# Altium footprint library JL_PCB.PCBLIB: 1112 footprints (part 12 of 71)
Each footprint in its own frame and in the unit in brackets; x right, y up, seen from the top. Pads: shape width x height; smd on the part's side, far side on the other; paste and mask are expansions set on the pad; w line width, h text height; cw(c..) or ccw(c..) is an arc to the next point about the centre after c.
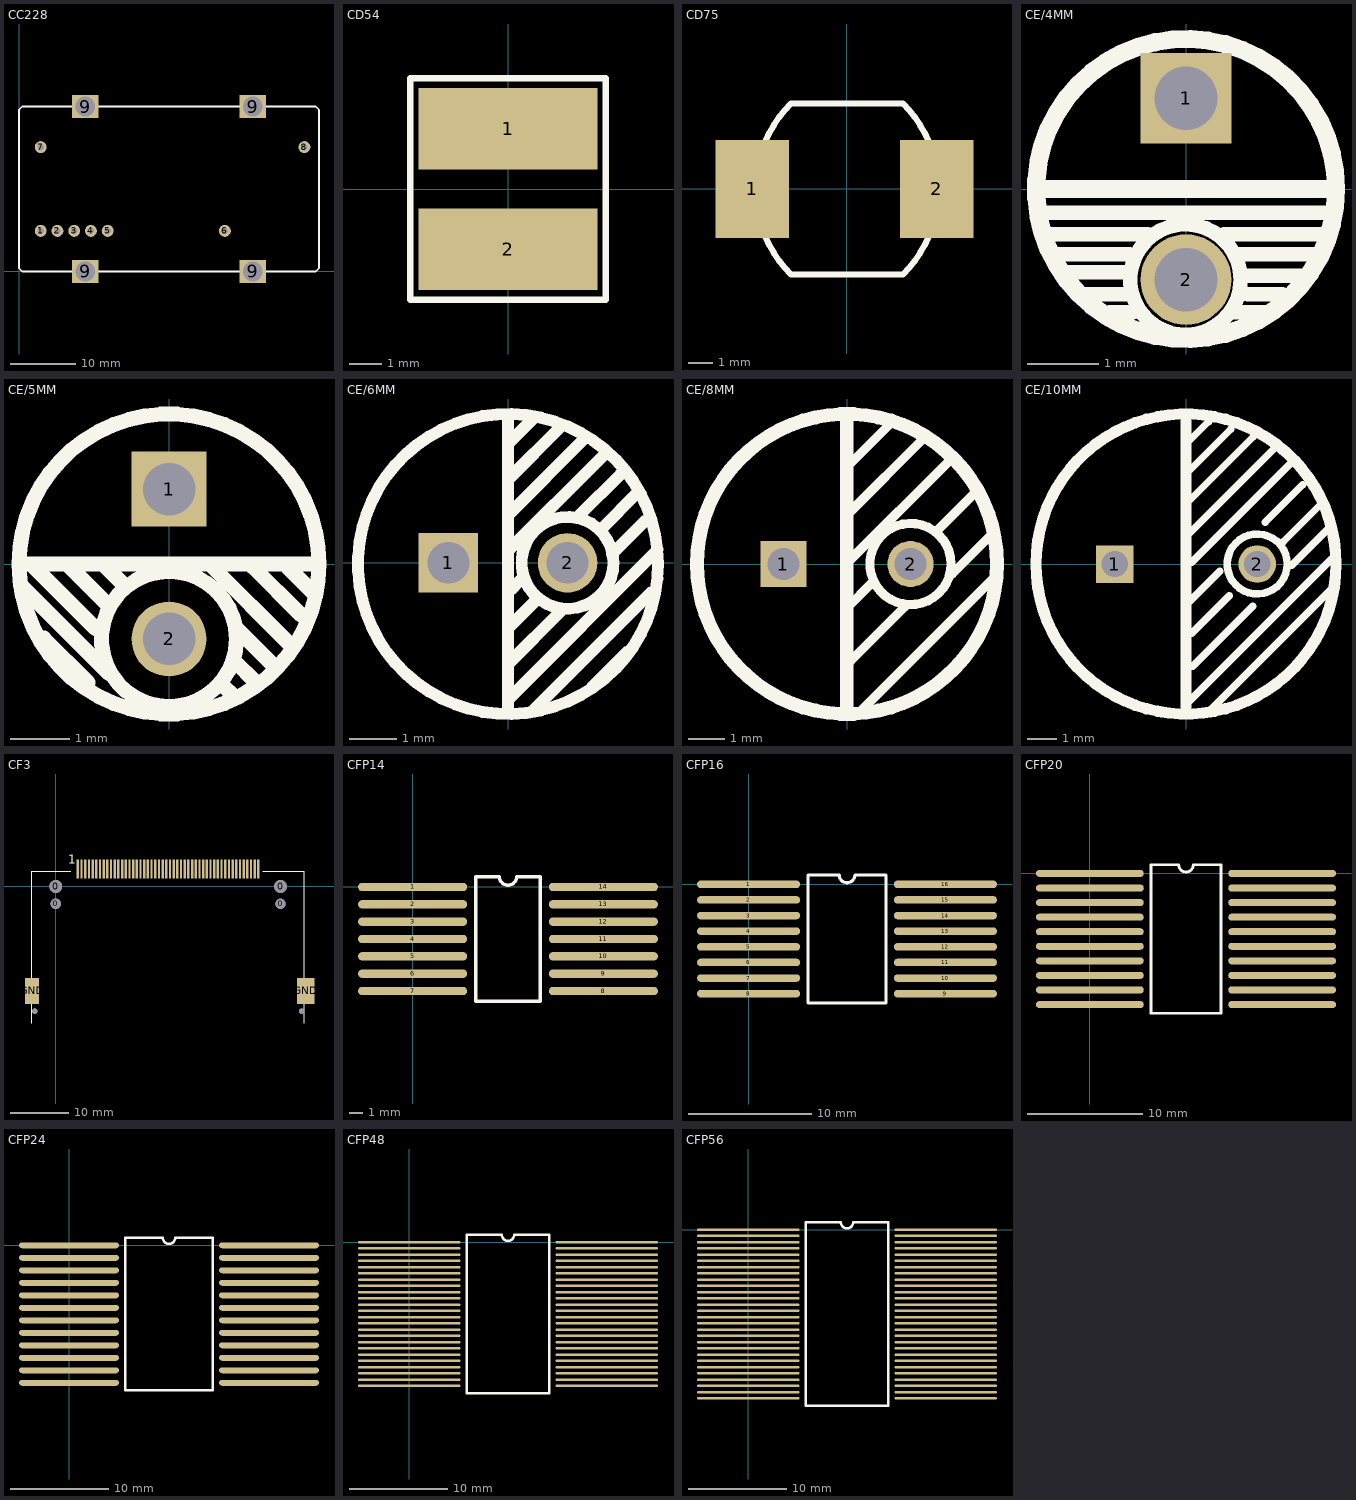
[diagram p11: the footprints below, top view; thin cyan lines are the x and y axes]

## CC228 [mm]
pads (12):
  round 1.8 hole 1: 1(3.29,6.15) 2(5.83,6.15) 3(8.37,6.15) 4(10.91,6.15) 5(13.45,6.15) 6(31.23,6.15) 7(3.29,18.85) 8(43.29,18.85)
  rect 4x3.5 hole 3: 9(10.05,0) 9(10.05,25) 9(35.45,0) 9(35.45,25)
TopOverlay:
  lines w0.254: 0,0.5 0.5,0 45,0 45.5,0.5 45.5,24.5 45,25 0.5,25 0,24.5 0,0.5

## CD54 [mm]
pads (2):
  rect 5.5x2.5 smd: 1(0,1.85) 2(0,-1.85)
TopOverlay:
  lines w0.203: -3,-3.4 -3,3.4 3,3.4 3,-3.4 -3,-3.4

## CD75 [mm]
height 5
pads (2):
  rect 3x4 smd: 1(-3.886,0) 2(3.683,0)
TopOverlay:
  lines w0.254: -2.3,-3.5 cw(c1.2,0) -2.3,3.5 2.3,3.5 cw(c-1.2,0) 2.3,-3.5 -2.3,-3.5
3D body "User Library-SDR0805.step": height 5.07, standoff 0.02, extent -3.728,-3.725 3.626,3.775

## CE/4MM [mil]
pads (2):
  rect 50x50 / inner round 50 / far side rect 50x50 hole 35: 1(0,50)
  round 50 hole 35: 2(0,-50)
TopOverlay:
  circle w8: c-0.29,-50 r30.45
  circle w10: c0,0 r82.77
  lines w8: -79,-13 77,-13 ; -76,-25 -21,-25 ; -73,-36 -31,-36 ; -65,-46 -33,-46 ; -55,-58 -33,-58 ; -42,-68 -29,-68 ; 21,-25 75,-25 ; 27,-68 43,-68 ; 30,-36 72,-36 ; 33,-48 63,-48 ; 34,-58 53,-58
  lines w10: -78.74,0 78.74,0

## CE/5MM [mil]
pads (2):
  rect 50x50 / inner round 50 / far side rect 50x50 hole 35: 1(0,50)
  round 50 hole 35: 2(0,-50)
TopOverlay:
  circle w10: c0,-50 r45
  circle w10: c0,0 r100
  lines w10: -100,0 100,0 ; -99,-14 -40,-73 ; -91,-1 -49,-43 ; -83.5,-49.5 -54,-79 ; -67,-1 -42,-26 ; -44,0 -31,-13 ; 27.5,-0.5 81,-54 ; 35.5,-80.5 43,-88 ; 43.5,-64.5 58,-79 ; 45,-43 71,-69 ; 55.5,-1.5 88,-34 ; 79,-2 96,-19

## CE/6MM [mil]
pads (2):
  rect 50x50 / inner round 50 / far side rect 50x50 hole 35: 1(-50,0)
  round 50 hole 35: 2(50,0)
TopOverlay:
  circle w10: c50,0 r38.6
  circle w10: c0,-1 r126.02
  lines w10: 0,-126 0,120 ; 0,-115 125,10 ; 0,-85 45,-40 ; 0,-55 25,-30 ; 0,10 80,90 ; 0,40 65,105 ; 0,70 45,115 ; 0,100 20,120 ; 2.5,-22.5 10,-15 ; 22.5,-122.5 120,-25 ; 60,40 95,75 ; 70,-105 100,-75 ; 77.5,27.5 110,60 ; 87.5,7.5 115,35

## CE/8MM [mil]
pads (2):
  rect 50x50 / inner round 50 / far side rect 50x50 hole 35: 1(-69,0)
  round 50 hole 35: 2(69,0)
TopOverlay:
  circle w10: c69,0 r44.07
  circle w15: c0,0 r162.93
  lines w10: -0.01,1.01 114.51,115.53 ; 0.29,-47.4 27.54,-20.15 ; 0.58,53.78 84.36,137.56 ; 2.03,107.41 49,154.37 ; 4.06,-105.09 62.62,-46.53 ; 13.63,-161.04 162.64,-12.03 ; 97.41,35.8 141.19,79.58 ; 114.23,-10.58 160.9,36.09
  lines w15: -0.29,-161.04 -0.29,160.75

## CE/10MM [mil]
pads (2):
  rect 50x50 / inner round 50 / far side rect 50x50 hole 35: 1(-95,0)
  round 50 hole 35: 2(95,0)
TopOverlay:
  circle w15: c0,0 r200
  circle w10: c95,0 r40
  lines w10: 0,-165 0,175 ; 0,80 90,170 ; 0,120 60,180 ; 0,160 30,190 ; 1.02,37.3 121.02,157.3 ; 3.96,-183.38 193.96,6.62 ; 5.14,-49.58 45.14,-9.58 ; 7.38,2.6 137.38,132.6 ; 7.61,-92.05 57.61,-42.05 ; 8.99,-136.19 88.99,-56.19 ; 27.55,-199.76 197.55,-29.76 ; 105.7,55.97 155.7,105.97 ; 130,30 180,80 ; 140.92,-1.48 190.92,48.52
  lines w15: 0,-190 0,190

## CF3 [mm]
pads (58):
  round 0.9 hole 0.9 unplated: 0(-3.63,-21.5) 0(42.37,-21.5)
  round 1.75 hole 1.75 unplated: 0(0,-3) 0(38.735,-3)
  round 2.2 hole 2.2 unplated: 0(0,0) 0(38.735,0)
  rect 0.4x3.302 smd: 1(3.81,3.004) 2(5.08,3.004) 3(6.35,3.004) 4(7.62,3.004) 5(8.89,3.004) 6(10.16,3.004) 7(11.43,3.004) 8(12.7,3.004) 9(13.97,3.004) 10(15.24,3.004) 11(16.51,3.004) 12(17.78,3.004) 13(19.05,3.004) 14(20.32,3.004) 15(21.59,3.004) 16(22.86,3.004) 17(24.13,3.004) 18(25.4,3.004) 19(26.67,3.004) 20(27.94,3.004) 21(29.21,3.004) 22(30.48,3.004) 23(31.75,3.004) 24(33.02,3.004) 25(34.29,3.004) 26(4.445,3.004) 27(5.715,3.004) 28(6.985,3.004) 29(8.255,3.004) 30(9.525,3.004) 31(10.795,3.004) 32(12.065,3.004) 33(13.335,3.004) 34(14.605,3.004) 35(15.875,3.004) 36(17.145,3.004) 37(18.415,3.004) 38(19.685,3.004) 39(20.955,3.004) 40(22.225,3.004) 41(23.495,3.004) 42(24.765,3.004) 43(26.035,3.004) 44(27.305,3.004) 45(28.575,3.004) 46(29.845,3.004) 47(31.115,3.004) 48(32.385,3.004) 49(33.655,3.004) 50(34.925,3.004)
  rect 2.4x4.5 smd: GND(-4.09,-18)
  rect 3x4.5 smd: GND(43.12,-18)
TopOverlay:
  lines w0.152: -4.13,2.6 2.585,2.6 ; 35.66,2.6 42.87,2.6
  lines w0.2: -4.13,-23.6 -4.13,2.6 ; 42.87,-23.6 42.87,2.6
  text "1" at 2.11,3.95 h1.52

## CF CARD [mil]

## CFP14 [mil]
pads (14):
  oval 315x24 smd: 1(0,0) 2(0,-50) 3(0,-100) 4(0,-150) 5(0,-200) 6(0,-250) 7(0,-300) 8(550,-300) 9(550,-250) 10(550,-200) 11(550,-150) 12(550,-100) 13(550,-50) 14(550,0)
TopOverlay:
  lines w10: 182,-330 182,30 250,30 ccw(c275,30) 300,30 368,30 368,-330 182,-330

## CFP16 [mil]
pads (16):
  oval 330x24 smd: 1(0,0) 2(0,-50) 3(0,-100) 4(0,-150) 5(0,-200) 6(0,-250) 7(0,-300) 8(0,-350) 9(630,-350) 10(630,-300) 11(630,-250) 12(630,-200) 13(630,-150) 14(630,-100) 15(630,-50) 16(630,0)
TopOverlay:
  lines w10: 190,-380 440,-380 440,30 340,30 cw(c315,30) 290,30 190,30 190,-380

## CFP20 [mil]
pads (20):
  oval 370x24 smd: 1(0,0) 2(0,-50) 3(0,-100) 4(0,-150) 5(0,-200) 6(0,-250) 7(0,-300) 8(0,-350) 9(0,-400) 10(0,-450) 11(660,-450) 12(660,-400) 13(660,-350) 14(660,-300) 15(660,-250) 16(660,-200) 17(660,-150) 18(660,-100) 19(660,-50) 20(660,0)
TopOverlay:
  lines w10: 210,-480 450,-480 450,30 355,30 cw(c330,30) 305,30 210,30 210,-480

## CFP24 [mil]
pads (24):
  oval 400x24 smd: 1(0,0) 2(0,-50) 3(0,-100) 4(0,-150) 5(0,-200) 6(0,-250) 7(0,-300) 8(0,-350) 9(0,-400) 10(0,-450) 11(0,-500) 12(0,-550) 13(800,-550) 14(800,-500) 15(800,-450) 16(800,-400) 17(800,-350) 18(800,-300) 19(800,-250) 20(800,-200) 21(800,-150) 22(800,-100) 23(800,-50) 24(800,0)
TopOverlay:
  lines w10: 225,-580 225,30 375,30 ccw(c400,30) 425,30 575,30 575,-580 225,-580

## CFP48 [mil]
pads (48):
  oval 410x10 smd: 1(0,0) 2(0,-25) 3(0,-50) 4(0,-75) 5(0,-100) 6(0,-125) 7(0,-150) 8(0,-175) 9(0,-200) 10(0,-225) 11(0,-250) 12(0,-275) 13(0,-300) 14(0,-325) 15(0,-350) 16(0,-375) 17(0,-400) 18(0,-425) 19(0,-450) 20(0,-475) 21(0,-500) 22(0,-525) 23(0,-550) 24(0,-575) 25(790,-575) 26(790,-550) 27(790,-525) 28(790,-500) 29(790,-475) 30(790,-450) 31(790,-425) 32(790,-400) 33(790,-375) 34(790,-350) 35(790,-325) 36(790,-300) 37(790,-275) 38(790,-250) 39(790,-225) 40(790,-200) 41(790,-175) 42(790,-150) 43(790,-125) 44(790,-100) 45(790,-75) 46(790,-50) 47(790,-25) 48(790,0)
TopOverlay:
  lines w10: 230,-605 230,30 370,30 ccw(c395,30) 420,30 560,30 560,-605 230,-605

## CFP56 [mil]
pads (56):
  oval 410x10 smd: 1(0,0) 2(0,-25) 3(0,-50) 4(0,-75) 5(0,-100) 6(0,-125) 7(0,-150) 8(0,-175) 9(0,-200) 10(0,-225) 11(0,-250) 12(0,-275) 13(0,-300) 14(0,-325) 15(0,-350) 16(0,-375) 17(0,-400) 18(0,-425) 19(0,-450) 20(0,-475) 21(0,-500) 22(0,-525) 23(0,-550) 24(0,-575) 25(0,-600) 26(0,-625) 27(0,-650) 28(0,-675) 29(790,-675) 30(790,-650) 31(790,-625) 32(790,-600) 33(790,-575) 34(790,-550) 35(790,-525) 36(790,-500) 37(790,-475) 38(790,-450) 39(790,-425) 40(790,-400) 41(790,-375) 42(790,-350) 43(790,-325) 44(790,-300) 45(790,-275) 46(790,-250) 47(790,-225) 48(790,-200) 49(790,-175) 50(790,-150) 51(790,-125) 52(790,-100) 53(790,-75) 54(790,-50) 55(790,-25) 56(790,0)
TopOverlay:
  lines w10: 230,-705 230,30 370,30 ccw(c395,30) 420,30 560,30 560,-705 230,-705